# Altium footprint library DrPCB.PcbLib: 910 footprints (part 3 of 57)
Each footprint in its own frame and in the unit in brackets; x right, y up, seen from the top. Pads: shape width x height; smd on the part's side, far side on the other; paste and mask are expansions set on the pad; w line width, h text height; cw(c..) or ccw(c..) is an arc to the next point about the centre after c.
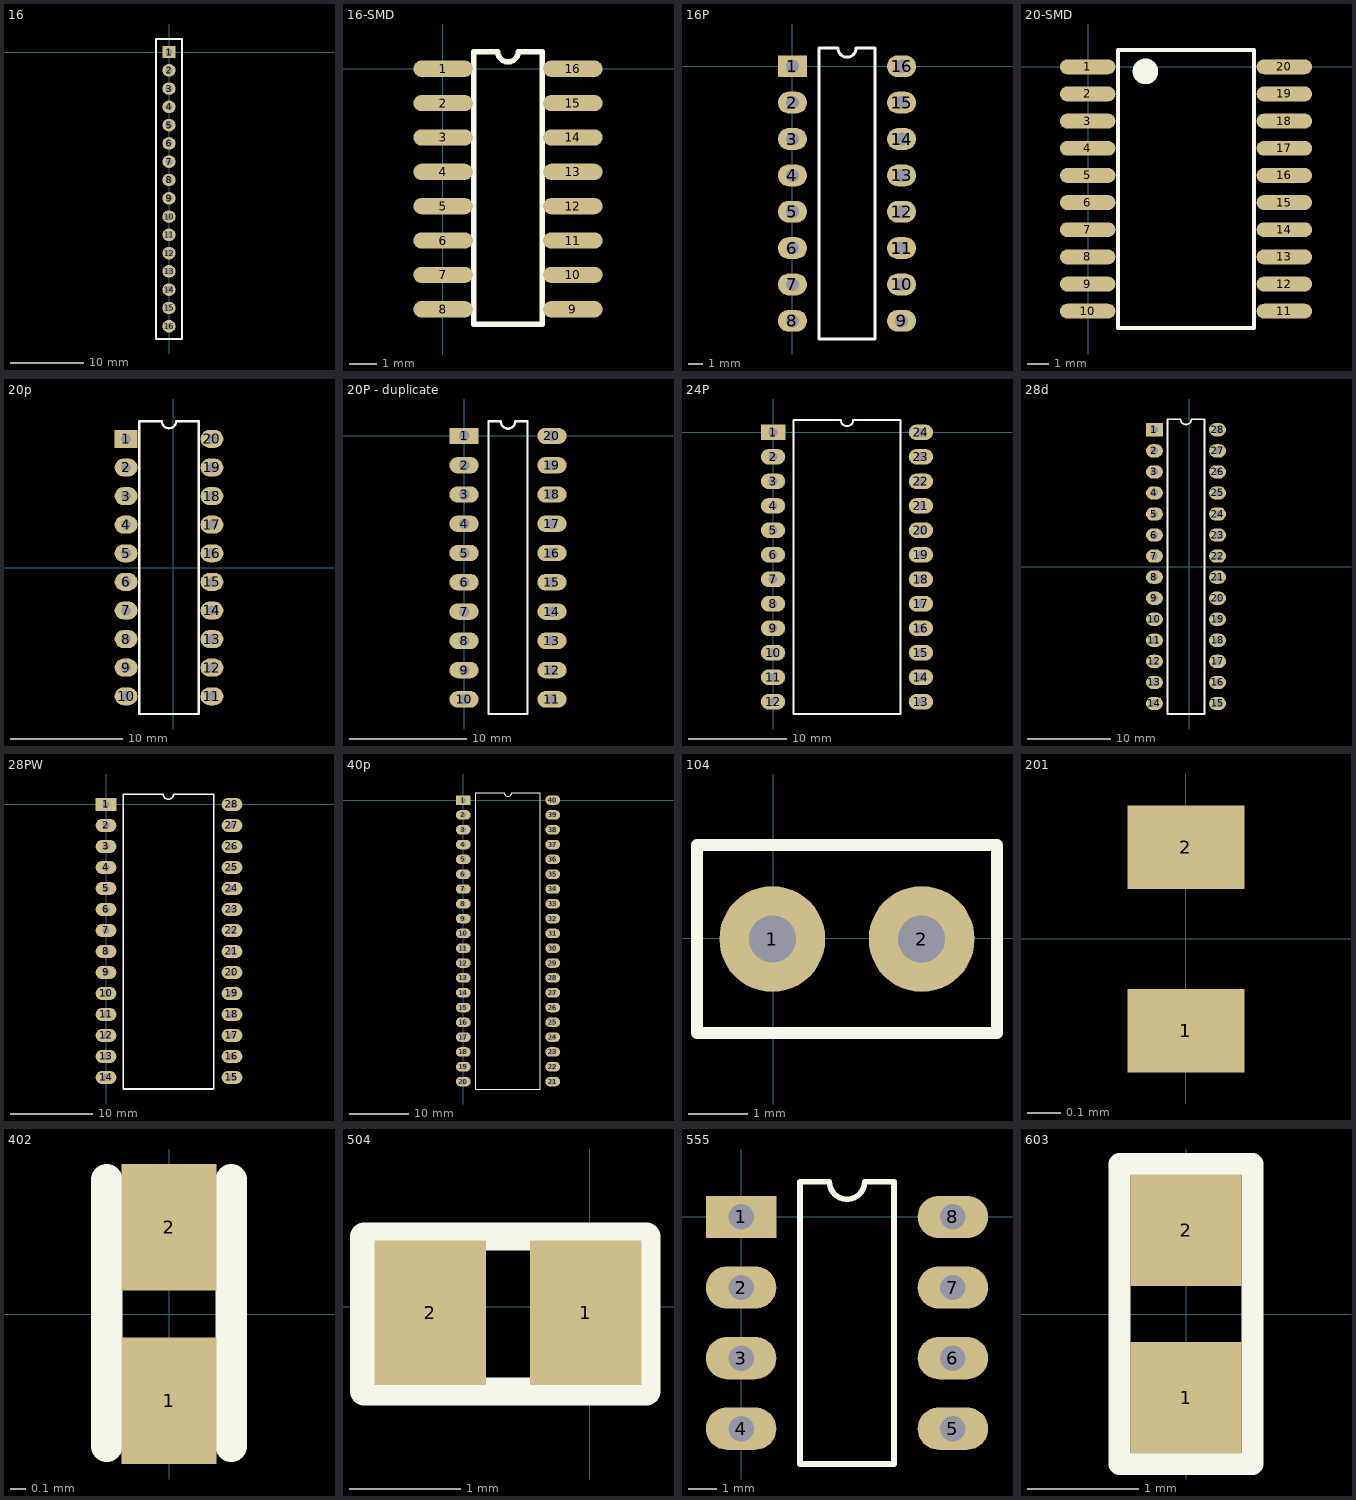
[diagram p2: the footprints below, top view; thin cyan lines are the x and y axes]

## 16 [mm]
pads (16):
  rect 1.8x1.7 hole 0.9: 1(0,0)
  oval 1.8x1.7 hole 0.9: 2(0,-2.5) 3(0,-5) 4(0,-7.5) 5(0,-10) 6(0,-12.5) 7(0,-15) 8(0,-17.5) 9(0,-20) 10(0,-22.5) 11(0,-25) 12(0,-27.5) 13(0,-30) 14(0,-32.5) 15(0,-35) 16(0,-37.5)
Top Overlay:
  lines w0.254: 1.778,1.651 1.778,-39.243 -1.778,-39.243 -1.778,1.778 1.778,1.778

## 16-SMD [mm]
pads (16):
  oval 2.2x0.6 smd: 1(0.013,0) 2(0.013,-1.27) 3(0.013,-2.54) 4(0.013,-3.81) 5(0.013,-5.08) 6(0.013,-6.35) 7(0.013,-7.62) 8(0.013,-8.89) 9(4.813,-8.89) 10(4.813,-7.62) 11(4.813,-6.35) 12(4.813,-5.08) 13(4.813,-3.81) 14(4.813,-2.54) 15(4.813,-1.27) 16(4.813,0)
Top Overlay:
  lines w0.2: 1.143,-9.445 1.143,0.635 2.032,0.635 ccw(c2.413,0.635) 2.794,0.635 3.683,0.635 3.683,-9.445 1.143,-9.445

## 16P [mm]
pads (16):
  rect 2x1.5 hole 0.9: 1(0,0)
  oval 2x1.5 hole 0.9: 2(0,-2.5) 3(0,-5) 4(0,-7.5) 5(0,-10) 6(0,-12.5) 7(0,-15) 8(0,-17.5) 9(7.5,-17.5) 10(7.5,-15) 11(7.5,-12.5) 12(7.5,-10) 13(7.5,-7.5) 14(7.5,-5) 15(7.5,-2.5) 16(7.5,0)
Top Overlay:
  lines w0.2: 1.835,-18.75 1.835,1.25 3.125,1.25 ccw(c3.75,1.25) 4.375,1.25 5.665,1.25 5.665,-18.75 1.835,-18.75

## 20-SMD [mm]
pads (20):
  oval 2.6x0.7 smd: 1(-0.028,0) 2(-0.028,-1.27) 3(-0.028,-2.54) 4(-0.028,-3.81) 5(-0.028,-5.08) 6(-0.028,-6.35) 7(-0.028,-7.62) 8(-0.028,-8.89) 9(-0.028,-10.16) 10(-0.028,-11.43) 11(9.172,-11.43) 12(9.172,-10.16) 13(9.172,-8.89) 14(9.172,-7.62) 15(9.172,-6.35) 16(9.172,-5.08) 17(9.172,-3.81) 18(9.172,-2.54) 19(9.172,-1.27) 20(9.172,0)
Top Overlay:
  circle w0.6: c2.672,-0.215 r0.3
  lines w0.2: 1.397,-12.215 1.397,0.785 7.747,0.785 7.747,-12.215 1.397,-12.215

## 20p [mil]
pads (20):
  rect 80x63 hole 35.43: 1(-165,450)
  oval 80x63 hole 35.43: 2(-165,350) 3(-165,250) 4(-165,150) 5(-165,50) 6(-165,-50) 7(-165,-150) 8(-165,-250) 9(-165,-350) 10(-165,-450) 11(135,-450) 12(135,-350) 13(135,-250) 14(135,-150) 15(135,-50) 16(135,50) 17(135,150) 18(135,250) 19(135,350) 20(135,450)
Top Overlay:
  lines w8: -119,-512 -119,512 -40,512 ccw(c-15,512) 10,512 89,512 89,-512 -119,-512

## 20P - duplicate [mm]
pads (20):
  rect 2.5x1.4 hole 0.9: 1(0,0)
  oval 2.5x1.4 hole 0.9: 2(0,-2.5) 3(0,-5) 4(0,-7.5) 5(0,-10) 6(0,-12.5) 7(0,-15) 8(0,-17.5) 9(0,-20) 10(0,-22.5) 11(7.5,-22.5) 12(7.5,-20) 13(7.5,-17.5) 14(7.5,-15) 15(7.5,-12.5) 16(7.5,-10) 17(7.5,-7.5) 18(7.5,-5) 19(7.5,-2.5) 20(7.5,0)
Top Overlay:
  lines w0.2: 2.085,-23.75 2.085,1.25 3.125,1.25 ccw(c3.75,1.25) 4.375,1.25 5.415,1.25 5.415,-23.75 2.085,-23.75

## 24P [mm]
pads (24):
  rect 2.5x1.6 hole 0.9: 1(0,0)
  oval 2.5x1.6 hole 0.9: 2(0,-2.5) 3(0,-5) 4(0,-7.5) 5(0,-10) 6(0,-12.5) 7(0,-15) 8(0,-17.5) 9(0,-20) 10(0,-22.5) 11(0,-25) 12(0,-27.5) 13(15.1,-27.5) 14(15.1,-25) 15(15.1,-22.5) 16(15.1,-20) 17(15.1,-17.5) 18(15.1,-15) 19(15.1,-12.5) 20(15.1,-10) 21(15.1,-7.5) 22(15.1,-5) 23(15.1,-2.5) 24(15.1,0)
Top Overlay:
  lines w0.2: 2.085,-28.75 13.015,-28.75 13.015,1.25 8.175,1.25 cw(c7.55,1.25) 6.925,1.25 2.085,1.25 2.085,-28.75

## 28d [mm]
pads (28):
  rect 2.032x1.6 hole 0.9: 1(-4.204,16.54)
  oval 2.032x1.6 hole 0.9: 2(-4.204,14) 3(-4.204,11.46) 4(-4.204,8.92) 5(-4.204,6.38) 6(-4.204,3.84) 7(-4.204,1.3) 8(-4.204,-1.24) 9(-4.204,-3.78) 10(-4.204,-6.32) 11(-4.204,-8.86) 12(-4.204,-11.4) 13(-4.204,-13.94) 14(-4.204,-16.48) 15(3.416,-16.48) 16(3.416,-13.94) 17(3.416,-11.4) 18(3.416,-8.86) 19(3.416,-6.32) 20(3.416,-3.78) 21(3.416,-1.24) 22(3.416,1.3) 23(3.416,3.84) 24(3.416,6.38) 25(3.416,8.92) 26(3.416,11.46) 27(3.416,14) 28(3.416,16.54)
Top Overlay:
  lines w0.203: -2.629,-17.75 1.842,-17.75 1.842,17.81 0.241,17.81 cw(c-0.394,17.81) -1.029,17.81 -2.629,17.81 -2.629,-17.75

## 28PW [mm]
pads (28):
  rect 2.5x1.6 hole 0.9: 1(0,0)
  oval 2.5x1.6 hole 0.9: 2(0,-2.54) 3(0,-5.08) 4(0,-7.62) 5(0,-10.16) 6(0,-12.7) 7(0,-15.24) 8(0,-17.78) 9(0,-20.32) 10(0,-22.86) 11(0,-25.4) 12(0,-27.94) 13(0,-30.48) 14(0,-33.02) 15(15.24,-33.02) 16(15.24,-30.48) 17(15.24,-27.94) 18(15.24,-25.4) 19(15.24,-22.86) 20(15.24,-20.32) 21(15.24,-17.78) 22(15.24,-15.24) 23(15.24,-12.7) 24(15.24,-10.16) 25(15.24,-7.62) 26(15.24,-5.08) 27(15.24,-2.54) 28(15.24,0)
Top Overlay:
  lines w0.2: 2.085,-34.417 2.085,1.25 6.925,1.25 ccw(c7.55,1.25) 8.175,1.25 13.015,1.25 13.015,-34.356 12.954,-34.417 2.085,-34.417

## 40p [mm]
pads (40):
  rect 2.5x1.6 hole 0.9: 1(0,0)
  oval 2.5x1.6 hole 0.9: 2(0,-2.5) 3(0,-5) 4(0,-7.5) 5(0,-10) 6(0,-12.5) 7(0,-15) 8(0,-17.5) 9(0,-20) 10(0,-22.5) 11(0,-25) 12(0,-27.5) 13(0,-30) 14(0,-32.5) 15(0,-35) 16(0,-37.5) 17(0,-40) 18(0,-42.5) 19(0,-45) 20(0,-47.5) 21(15.1,-47.5) 22(15.1,-45) 23(15.1,-42.5) 24(15.1,-40) 25(15.1,-37.5) 26(15.1,-35) 27(15.1,-32.5) 28(15.1,-30) 29(15.1,-27.5) 30(15.1,-25) 31(15.1,-22.5) 32(15.1,-20) 33(15.1,-17.5) 34(15.1,-15) 35(15.1,-12.5) 36(15.1,-10) 37(15.1,-7.5) 38(15.1,-5) 39(15.1,-2.5) 40(15.1,0)
Top Overlay:
  lines w0.2: 2.085,-48.75 2.085,1.25 6.925,1.25 ccw(c7.55,1.25) 8.175,1.25 13.015,1.25 13.015,-48.75 2.085,-48.75

## 104 [mm]
pads (2):
  round 1.8 hole 0.8: 1(-0.014,-0.009) 2(2.526,-0.009)
Top Overlay:
  lines w0.2: -1.294,-1.609 3.806,-1.609 3.806,1.591 -1.294,1.591 -1.294,-1.609

## 201 [mm]
pads (2):
  rect 0.35x0.25 smd mask+0.05: 1(0,-0.275) 2(0,0.275)

## 402 [mm]
pads (2):
  rect 0.6x0.8 smd: 1(0,-0.55) 2(0,0.55)
Top Overlay:
  lines w0.2: -0.394,-0.838 -0.394,0.851 ; 0.394,-0.838 0.394,0.851

## 504 [mm]
pads (2):
  rect 1x1.3 smd: 1(-0.037,-0.051) 2(-1.437,-0.051)
Top Overlay:
  lines w0.254: -2.032,-0.762 0.508,-0.762 0.508,0.635 -2.032,0.635 -2.032,-0.762

## 555 [mm]
pads (8):
  rect 2.5x1.5 hole 0.9: 1(0,0)
  oval 2.5x1.5 hole 0.9: 2(0,-2.5) 3(0,-5) 4(0,-7.5) 5(7.5,-7.5) 6(7.5,-5) 7(7.5,-2.5) 8(7.5,0)
Top Overlay:
  lines w0.2: 2.085,-8.75 2.085,1.25 3.125,1.25 ccw(c3.75,1.25) 4.375,1.25 5.415,1.25 5.415,-8.75 2.085,-8.75

## 603 [mm]
pads (2):
  rect 1x1 smd: 1(0,-0.75) 2(0,0.75)
Top Overlay:
  lines w0.2: -0.597,-1.346 0.597,-1.346 0.597,1.346 -0.597,1.346 -0.597,-1.346